# Altium footprint library General.PcbLib: 446 footprints (part 10 of 28)
Each footprint in its own frame and in the unit in brackets; x right, y up, seen from the top. Pads: shape width x height; smd on the part's side, far side on the other; paste and mask are expansions set on the pad; w line width, h text height; cw(c..) or ccw(c..) is an arc to the next point about the centre after c.
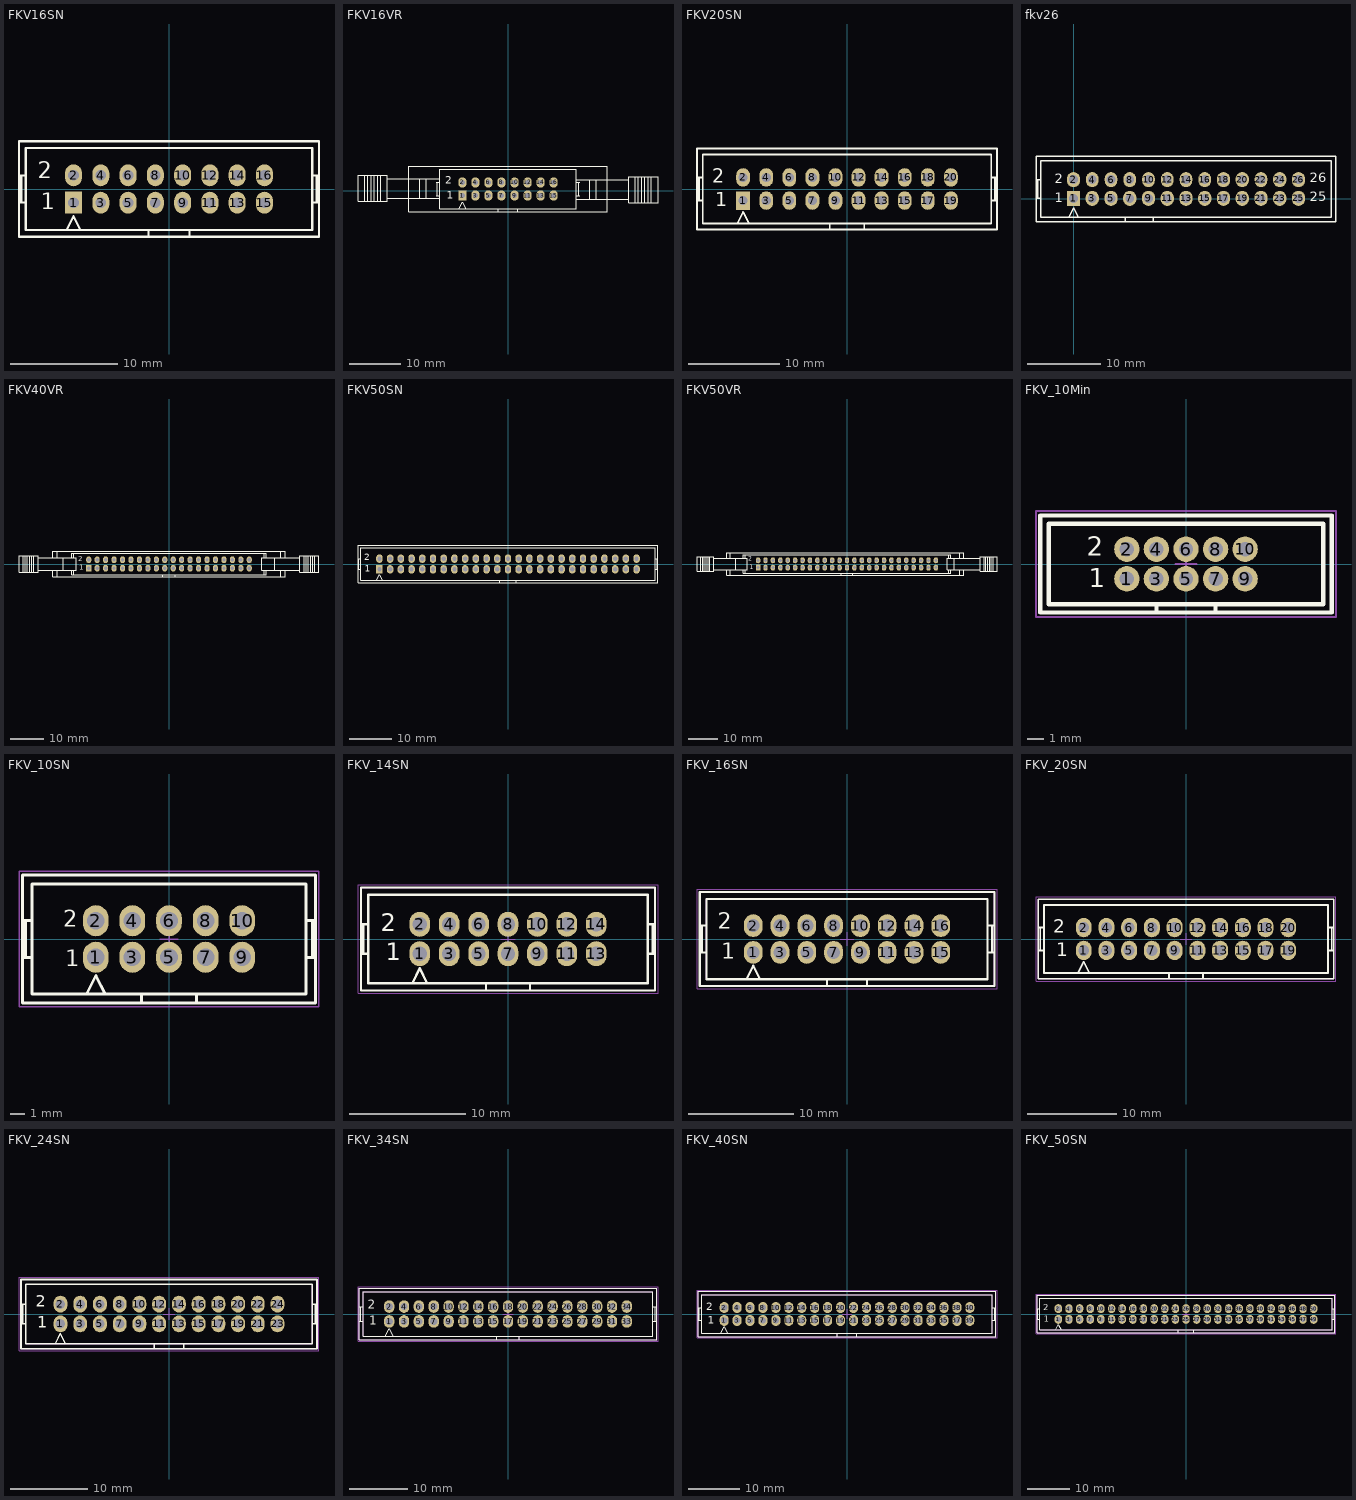
[diagram p9: the footprints below, top view; thin cyan lines are the x and y axes]

## FKV16SN [mil]
pads (16):
  rect 62x80 hole 39.37: 1(-350,-50)
  oval 62x80 hole 39.37: 2(-350,50) 3(-250,-50) 4(-250,50) 5(-150,-50) 6(-150,50) 7(-50,-50) 8(-50,50) 9(50,-50) 10(50,50) 11(150,-50) 12(150,50) 13(250,-50) 14(250,50) 15(350,-50) 16(350,50)
Top Overlay:
  lines w8: -550,-50 -525,-50 ; -550,50 -525,50 ; -541.67,-50 -541.67,50 ; -375,-150 -350,-100 -325,-150 ; -75,-175 -75,-150 ; 75,-175 75,-150 ; 525,-50 550,-50 ; 525,50 550,50 ; 541.67,-50 541.67,-41.67 541.67,50 ; -75,-150 75,-150 ; -75,-150 -525,-150 -525,150 525,150 525,-150 75,-150 ; -550,-175 550,-175 550,175 -550,175 -550,-175
  text "1" at -470,-74 h60
  text "2" at -482,39 h60

## FKV16VR [mil]
pads (16):
  rect 62x80 hole 39.37: 1(-350,-35)
  oval 62x80 hole 39.37: 2(-350,65) 3(-250,-35) 4(-250,65) 5(-150,-35) 6(-150,65) 7(-50,-35) 8(-50,65) 9(50,-35) 10(50,65) 11(150,-35) 12(150,65) 13(250,-35) 14(250,65) 15(350,-35) 16(350,65)
Top Overlay:
  lines w8: -1100,-80 -1100,120 ; -1075,-80 -1075,120 ; -1050,-80 -1050,120 ; -1025,-80 -1025,120 ; -1000,-80 -1000,120 ; -975,-80 -975,120 ; -925,-55 -525,-55 -525,-105 ; -925,95 -525,95 -525,145 ; -675,-55 -675,95 ; -625,-55 -625,95 ; -550,-35 -525,-35 ; -550,65 -525,65 ; -541.67,-35 -541.67,65 ; -375,-135 -350,-85 -325,-135 ; -75,-160 -75,-135 ; 75,-160 75,-135 ; 525,-115 525,-65 925,-65 ; 525,-35 550,-35 ; 525,65 550,65 ; 525,135 525,85 925,85 ; 541.67,-35 541.67,-26.67 541.67,65 ; 625,-65 625,85 ; 675,-65 675,85 ; 975,-90 975,110 ; 1000,-90 1000,110 ; 1025,-90 1025,110 ; 1050,-90 1050,110 ; 1075,-90 1075,110 ; 1100,-90 1100,110 ; -550,190 760,190 ; -550,190 760,190 ; -550,190 760,190 ; -75,-135 75,-135 ; -75,-135 -525,-135 -525,165 525,165 525,-135 75,-135 ; 760,190 -760,190 -760,-160 760,-160 760,190 ; -1150,-80 -925,-80 -925,120 -1150,120 -1150,-80 ; 925,-90 925,110 1150,110 1150,-90 925,-90
  text "1" at -470,-59 h60
  text "2" at -482,54 h60

## FKV20SN [mil]
height 47.24
pads (20):
  rect 60x80 hole 39.37: 1(-450,-50)
  oval 60x80 hole 39.37: 2(-450,50) 3(-350,-50) 4(-350,50) 5(-250,-50) 6(-250,50) 7(-150,-50) 8(-150,50) 9(-50,-50) 10(-50,50) 11(50,-50) 12(50,50) 13(150,-50) 14(150,50) 15(250,-50) 16(250,50) 17(350,-50) 18(350,50) 19(450,-50) 20(450,50)
Top Overlay:
  lines w8: -650,-50 -625,-50 ; -650,50 -625,50 ; -641.67,-50 -641.67,50 ; -475,-150 -450,-100 -425,-150 ; -75,-175 -75,-150 ; 75,-175 75,-150 ; 625,-50 650,-50 ; 625,50 650,50 ; 641.67,-50 641.67,50 ; -75,-150 75,-150 ; -75,-150 -625,-150 -625,150 625,150 625,-150 75,-150 ; -650,-175 650,-175 650,175 -650,175 -650,-175
  text "1" at -572,-75 h60
  text "2" at -585,27 h60

## fkv26 [mm]
pads (26):
  rect 1.8x2.032 hole 1.2: 1(0,0.025)
  oval 1.8x2.032 hole 1.2: 2(0,2.565) 3(2.54,0.025) 5(5.08,0.025) 7(7.62,0.025) 9(10.16,0.025) 11(12.7,0.025) 13(15.24,0.025) 15(17.78,0.025) 17(20.32,0.025) 18(20.32,2.565) 19(22.86,0.025) 20(22.86,2.565) 21(25.4,0.025) 23(27.94,0.025) 24(27.94,2.565) 25(30.48,0.025) 26(30.48,2.565)
  oval 1.7x2.032 hole 1.2: 4(2.54,2.565) 6(5.08,2.565) 8(7.62,2.565) 10(10.16,2.565) 12(12.7,2.565) 14(15.24,2.565) 16(17.78,2.565) 22(25.4,2.565)
Top Overlay:
  lines w0.203: -5.08,0.025 -4.445,0.025 ; -5.08,2.565 -4.445,2.565 ; -4.868,0.025 -4.868,2.565 ; -0.635,-2.515 0,-1.245 0.635,-2.515 ; 6.985,-3.15 6.985,-2.515 ; 10.795,-3.15 10.795,-2.515 ; 6.985,-2.515 -4.445,-2.515 -4.445,5.105 34.925,5.105 34.925,-2.515 10.795,-2.515 ; 6.985,-2.515 10.795,-2.515 ; -5.08,-3.15 -5.08,5.74 35.56,5.74 35.56,-3.15 -5.08,-3.15
  text "26" at 32.004,2.184 h1.27
  text "25" at 32.004,-0.356 h1.27
  text "1" at -2.54,-0.483 h1.27
  text "2" at -2.54,2.057 h1.27

## FKV40VR [mil]
height 47.24
pads (40):
  rect 60x80 hole 39.37: 1(-950,-50)
  oval 60x80 hole 39.37: 2(-950,50) 3(-850,-50) 4(-850,50) 5(-750,-50) 6(-750,50) 7(-650,-50) 8(-650,50) 9(-550,-50) 10(-550,50) 11(-450,-50) 12(-450,50) 13(-350,-50) 14(-350,50) 15(-250,-50) 16(-250,50) 17(-150,-50) 18(-150,50) 19(-50,-50) 20(-50,50) 21(50,-50) 22(50,50) 23(150,-50) 24(150,50) 25(250,-50) 26(250,50) 27(350,-50) 28(350,50) 29(450,-50) 30(450,50) 31(550,-50) 32(550,50) 33(650,-50) 34(650,50) 35(750,-50) 36(750,50) 37(850,-50) 38(850,50) 39(950,-50) 40(950,50)
Top Overlay:
  lines w8: -1725,-100 -1725,100 ; -1700,-100 -1700,100 ; -1675,-100 -1675,100 ; -1650,-100 -1650,100 ; -1625,-100 -1625,100 ; -1600,-100 -1600,100 ; -1550,-75 -1150,-75 ; -1550,75 -1150,75 ; -1375,-75 -1375,-150 1375,-150 1375,-75 ; -1375,75 -1375,150 1375,150 1375,75 ; -1325,-150 -1325,-75 ; -1325,75 -1325,150 ; -1250,-75 -1250,75 ; -1125,-125 -1125,-75 ; -1125,75 -1125,125 ; -75,-150 -75,-125 ; 75,-150 75,-125 ; 1125,-125 1125,-75 ; 1125,75 1125,125 ; 1250,-75 1250,75 ; 1325,-150 1325,-75 ; 1325,75 1325,150 ; 1550,-75 1150,-75 ; 1550,75 1150,75 ; 1600,-100 1600,100 ; 1625,-100 1625,100 ; 1650,-100 1650,100 ; 1675,-100 1675,100 ; 1700,-100 1700,100 ; 1725,-100 1725,100 ; -1150,-75 -1100,-75 -1100,75 -1150,75 ; -1150,-75 -1150,-125 -75,-125 ; -1150,75 -1150,125 1150,125 1150,75 ; -75,-125 75,-125 ; 75,-125 1150,-125 1150,-75 ; 1150,-75 1100,-75 1100,75 1150,75 ; 1775,-100 1775,100 ; 1775,-100 1775,100 ; 1775,-100 1775,100 ; 1775,-100 1550,-100 1550,100 1775,100 ; -1775,-100 -1775,100 -1550,100 -1550,-100 -1775,-100
  text "2" at -1072,35 h60
  text "1" at -1062,-70 h60

## FKV50SN [mil]
height 47.24
pads (50):
  rect 60x80 hole 39.37: 1(-1200,-50)
  oval 60x80 hole 39.37: 2(-1200,50) 3(-1100,-50) 4(-1100,50) 5(-1000,-50) 6(-1000,50) 7(-900,-50) 8(-900,50) 9(-800,-50) 10(-800,50) 11(-700,-50) 12(-700,50) 13(-600,-50) 14(-600,50) 15(-500,-50) 16(-500,50) 17(-400,-50) 18(-400,50) 19(-300,-50) 20(-300,50) 21(-200,-50) 22(-200,50) 23(-100,-50) 24(-100,50) 25(0,-50) 26(0,50) 27(100,-50) 28(100,50) 29(200,-50) 30(200,50) 31(300,-50) 32(300,50) 33(400,-50) 34(400,50) 35(500,-50) 36(500,50) 37(600,-50) 38(600,50) 39(700,-50) 40(700,50) 41(800,-50) 42(800,50) 43(900,-50) 44(900,50) 45(1000,-50) 46(1000,50) 47(1100,-50) 48(1100,50) 49(1200,-50) 50(1200,50)
Top Overlay:
  lines w8: -1400,-50 -1375,-50 ; -1400,50 -1375,50 ; -1391.67,-50 -1391.67,50 ; -1225,-150 -1200,-100 -1175,-150 ; -75,-175 -75,-150 ; 75,-175 75,-150 ; 1375,-50 1400,-50 ; 1375,50 1400,50 ; 1391.67,-50 1391.67,50 ; -75,-150 75,-150 ; -75,-150 -1375,-150 -1375,150 1375,150 1375,-150 75,-150 ; -1400,-175 1400,-175 1400,175 -1400,175 -1400,-175
  text "2" at -1343,34 h60
  text "1" at -1335,-71 h60

## FKV50VR [mil]
pads (50):
  rect 60x80 hole 39.37: 1(-1200,-50)
  oval 60x80 hole 39.37: 2(-1200,50) 3(-1100,-50) 4(-1100,50) 5(-1000,-50) 6(-1000,50) 7(-900,-50) 8(-900,50) 9(-800,-50) 10(-800,50) 11(-700,-50) 12(-700,50) 13(-600,-50) 14(-600,50) 15(-500,-50) 16(-500,50) 17(-400,-50) 18(-400,50) 19(-300,-50) 20(-300,50) 21(-200,-50) 22(-200,50) 23(-100,-50) 24(-100,50) 25(0,-50) 26(0,50) 27(100,-50) 28(100,50) 29(200,-50) 30(200,50) 31(300,-50) 32(300,50) 33(400,-50) 34(400,50) 35(500,-50) 36(500,50) 37(600,-50) 38(600,50) 39(700,-50) 40(700,50) 41(800,-50) 42(800,50) 43(900,-50) 44(900,50) 45(1000,-50) 46(1000,50) 47(1100,-50) 48(1100,50) 49(1200,-50) 50(1200,50)
Top Overlay:
  lines w8: -1975,-100 -1975,100 ; -1950,-100 -1950,100 ; -1925,-100 -1925,100 ; -1900,-100 -1900,100 ; -1875,-100 -1875,100 ; -1850,-100 -1850,100 ; -1800,-75 -1400,-75 ; -1800,75 -1400,75 ; -1625,-75 -1625,-150 1575,-150 1575,-75 ; -1625,75 -1625,150 1575,150 1575,75 ; -1575,-150 -1575,-75 ; -1575,75 -1575,150 ; -1500,-75 -1500,75 ; -1375,-125 -1375,-75 ; -1375,75 -1375,125 ; -75,-150 -75,-125 ; 75,-150 75,-125 ; 1375,-125 1375,-75 ; 1375,75 1375,125 ; 1450,-75 1450,75 ; 1525,-150 1525,-75 ; 1525,75 1525,150 ; 1800,-75 1400,-75 ; 1800,75 1400,75 ; 1850,-100 1850,100 ; 1875,-100 1875,100 ; 1900,-100 1900,100 ; 1925,-100 1925,100 ; 1950,-100 1950,100 ; 1975,-100 1975,100 ; -1400,-75 -1350,-75 -1350,75 -1400,75 ; -1400,-75 -1400,-125 -75,-125 ; -1400,75 -1400,125 1400,125 1400,75 ; -75,-125 75,-125 ; 75,-125 1400,-125 1400,-75 ; 1400,-75 1350,-75 1350,75 1400,75 ; -2025,-100 -2025,100 -1800,100 -1800,-100 -2025,-100 ; 1800,-100 1800,100 2025,100 2025,-100 1800,-100
  text "2" at -1330,47 h60
  text "1" at -1314,-73 h60

## FKV_10Min [mil] "Connector; BoxHeader; 5x2 Position ,2.54mm Pitch"
height 346.46
pads (10):
  round 60 hole 34: 1(-140,-35) 2(-140,35) 3(-70,-35) 4(-70,35) 5(0,-35) 6(0,35) 7(70,-35) 8(70,35) 9(140,-35) 10(140,35)
Top Overlay:
  lines w10: -70,-115 -70,-95 ; 70,-115 70,-95 ; -345,-115 345,-115 345,115 -345,115 -345,-115 ; -325,-95 325,-95 325,95 -325,95 -325,-95
  text "2" at -235,20 h45
  text "1" at -230,-55 h45
Mechanical 15:
  lines w5: -25,0 0,0 ; 0,-25 0,0 ; 0,25 0,0 ; 25,0 0,0 ; -355,-125 355,-125 355,125 -330,125 -355,125 -355,-125
3D body: height 220, standoff 0, extent 70,-110 340,-90
3D body: height 220, standoff 0, extent -340,-110 -70,-90
3D body: height 220, standoff 0, extent 320,-110 340,110
3D body: height 220, standoff 0, extent -340,90 340,110
3D body: height 220, standoff 0, extent -340,-110 -320,110
3D body: height 20, standoff 0, extent -340,-110 340,110
3D body: height 220, standoff -110, extent -150,-45 -130,-25
3D body: height 220, standoff -110, extent -80,-45 -60,-25
3D body: height 220, standoff -110, extent -10,-45 10,-25
3D body: height 220, standoff -110, extent 60,-45 80,-25
3D body: height 220, standoff -110, extent 130,-45 150,-25
3D body: height 220, standoff -110, extent 130,25 150,45
3D body: height 220, standoff -110, extent 60,25 80,45
3D body: height 220, standoff -110, extent -10,25 10,45
3D body: height 220, standoff -110, extent -80,25 -60,45
3D body: height 220, standoff -110, extent -150,25 -130,45

## FKV_10SN [mil] "Connector; BoxHeader; 5x2 Position ,2.54mm Pitch"
height 346.46
pads (10):
  oval 70x85 hole 48: 1(-200,-50) 2(-200,50) 3(-100,-50) 4(-100,50) 5(0,-50) 6(0,50) 7(100,-50) 8(100,50) 9(200,-50) 10(200,50)
Top Overlay:
  lines w8: -400,-50 -375,-50 ; -400,50 -375,50 ; -391.67,-50 -391.67,50 ; -225,-150 -200,-100 -175,-150 ; -75,-175 -75,-150 ; 75,-175 75,-150 ; 375,-50 400,-50 ; 375,50 400,50 ; 391.67,-50 391.67,50 ; -75,-150 -375,-150 -375,150 375,150 375,-150 75,-150 ; -75,-150 75,-150 ; -400,-175 400,-175 400,175 -400,175 -400,-175
  text "2" at -289,33 h45
  text "1" at -283,-75 h45
Mechanical 13:
  lines w3.94: -75,-175 -75,-150 ; 75,-175 75,-150 ; -75,-150 75,-150 ; -75,-150 -375,-150 -375,150 375,150 375,-150 75,-150 ; 87.5,-62.5 100,-62.5 ; 87.5,-62.5 87.5,-50 ; 87.5,-62.5 100,-62.5 ; 87.5,-62.5 87.5,-50 ; 87.5,-50 87.5,-37.5 ; 87.5,-50 87.5,-37.5 ; 87.5,-37.5 100,-37.5 ; 87.5,-37.5 100,-37.5 ; 100,-62.5 112.5,-62.5 ; 100,-62.5 112.5,-62.5 ; 100,-37.5 112.5,-37.5 ; 100,-37.5 112.5,-37.5 ; 112.5,-62.5 112.5,-50 ; 112.5,-62.5 112.5,-50 ; 112.5,-50 112.5,-37.5 ; 112.5,-50 112.5,-37.5 ; -400,-175 -400,175 400,175 400,-175 -400,-175 ; -212.5,-62.5 -212.5,-50 -212.5,-37.5 -200,-37.5 -187.5,-37.5 -187.5,-50 -187.5,-62.5 -200,-62.5 -212.5,-62.5 ; -212.5,37.5 -200,37.5 -187.5,37.5 -187.5,50 -187.5,62.5 -200,62.5 -212.5,62.5 -212.5,50 -212.5,37.5 ; -112.5,-62.5 -100,-62.5 -87.5,-62.5 -87.5,-50 -87.5,-37.5 -100,-37.5 -112.5,-37.5 -112.5,-50 -112.5,-62.5 ; -112.5,37.5 -100,37.5 -87.5,37.5 -87.5,50 -87.5,62.5 -100,62.5 -112.5,62.5 -112.5,50 -112.5,37.5 ; -12.5,-62.5 0,-62.5 12.5,-62.5 12.5,-50 12.5,-37.5 0,-37.5 -12.5,-37.5 -12.5,-50 -12.5,-62.5 ; -12.5,37.5 0,37.5 12.5,37.5 12.5,50 12.5,62.5 0,62.5 -12.5,62.5 -12.5,50 -12.5,37.5 ; 87.5,37.5 100,37.5 112.5,37.5 112.5,50 112.5,62.5 100,62.5 87.5,62.5 87.5,50 87.5,37.5 ; 187.5,-62.5 200,-62.5 212.5,-62.5 212.5,-50 212.5,-37.5 200,-37.5 187.5,-37.5 187.5,-50 187.5,-62.5 ; 187.5,37.5 200,37.5 212.5,37.5 212.5,50 212.5,62.5 200,62.5 187.5,62.5 187.5,50 187.5,37.5
Mechanical 15:
  lines w3.94: -25,0 0,0 ; 0,-25 0,0 ; 0,25 0,0 ; 25,0 0,0 ; -410,-185 410,-185 410,185 -410,185 -410,-185
3D body: height 314.96, standoff -129.92, extent -212.48,37.52 -187.52,62.48
3D body: height 314.96, standoff -129.92, extent -112.48,37.52 -87.52,62.48
3D body: height 314.96, standoff -129.92, extent -12.48,37.52 12.48,62.48
3D body: height 314.96, standoff -129.92, extent 87.52,37.52 112.48,62.48
3D body: height 314.96, standoff -129.92, extent 187.52,37.52 212.48,62.48
3D body: height 314.96, standoff -129.92, extent 187.52,-62.48 212.48,-37.52
3D body: height 314.96, standoff -129.92, extent 87.52,-62.48 112.48,-37.52
3D body: height 314.96, standoff -129.92, extent -12.48,-62.48 12.48,-37.52
3D body: height 314.96, standoff -129.92, extent -112.48,-62.48 -87.52,-37.52
3D body: height 314.96, standoff -129.92, extent -212.48,-62.48 -187.52,-37.52
3D body: height 118.11, standoff 0, extent -74.98,-174.98 74.98,-150.02
3D body: height 78.74, standoff 0, extent -374.98,-149.98 374.98,149.98
3D body: height 346.46, standoff 0, extent -399.98,-174.98 399.98,174.98

## FKV_14SN [mil] "Connector; BoxHeader; 7x2 Position ,2.54mm Pitch"
height 346.46
pads (14):
  oval 70x85 hole 48: 1(-300,-50) 2(-300,50) 3(-200,-50) 4(-200,50) 5(-100,-50) 6(-100,50) 7(0,-50) 8(0,50) 9(100,-50) 10(100,50) 11(200,-50) 12(200,50) 13(300,-50) 14(300,50)
Top Overlay:
  lines w8: -500,-50 -475,-50 ; -500,50 -475,50 ; -491.67,-50 -491.67,50 ; -325,-150 -300,-100 -275,-150 ; -75,-175 -75,-150 ; 75,-175 75,-150 ; 475,-50 500,-50 ; 475,50 500,50 ; 491.67,-50 491.67,50 ; -75,-150 -475,-150 -475,150 475,150 475,-150 75,-150 ; -75,-150 75,-150 ; -500,-175 -500,175 500,175 500,-175 -500,-175
  text "1" at -415,-73 h60
  text "2" at -432,26 h60
Mechanical 13:
  lines w3.94: -75,-175 -75,-150 ; 75,-175 75,-150 ; -75,-150 75,-150 ; -75,-150 -475,-150 -475,150 475,150 475,-150 75,-150 ; -500,-175 500,-175 500,175 -500,175 -500,-175 ; -312.5,-62.5 -312.5,-50 -312.5,-37.5 -300,-37.5 -287.5,-37.5 -287.5,-50 -287.5,-62.5 -300,-62.5 -312.5,-62.5 ; -312.5,37.5 -300,37.5 -287.5,37.5 -287.5,50 -287.5,62.5 -300,62.5 -312.5,62.5 -312.5,50 -312.5,37.5 ; -212.5,-62.5 -200,-62.5 -187.5,-62.5 -187.5,-50 -187.5,-37.5 -200,-37.5 -212.5,-37.5 -212.5,-50 -212.5,-62.5 ; -212.5,37.5 -200,37.5 -187.5,37.5 -187.5,50 -187.5,62.5 -200,62.5 -212.5,62.5 -212.5,50 -212.5,37.5 ; -112.5,-62.5 -112.5,-50 -112.5,-37.5 -100,-37.5 -87.5,-37.5 -87.5,-50 -87.5,-62.5 -100,-62.5 -112.5,-62.5 ; -112.5,37.5 -100,37.5 -87.5,37.5 -87.5,50 -87.5,62.5 -100,62.5 -112.5,62.5 -112.5,50 -112.5,37.5 ; -12.5,-62.5 0,-62.5 12.5,-62.5 12.5,-50 12.5,-37.5 0,-37.5 -12.5,-37.5 -12.5,-50 -12.5,-62.5 ; -12.5,37.5 0,37.5 12.5,37.5 12.5,50 12.5,62.5 0,62.5 -12.5,62.5 -12.5,50 -12.5,37.5 ; 87.5,-62.5 87.5,-50 87.5,-37.5 100,-37.5 112.5,-37.5 112.5,-50 112.5,-62.5 100,-62.5 87.5,-62.5 ; 87.5,37.5 100,37.5 112.5,37.5 112.5,50 112.5,62.5 100,62.5 87.5,62.5 87.5,50 87.5,37.5 ; 187.5,-62.5 200,-62.5 212.5,-62.5 212.5,-50 212.5,-37.5 200,-37.5 187.5,-37.5 187.5,-50 187.5,-62.5 ; 187.5,37.5 200,37.5 212.5,37.5 212.5,50 212.5,62.5 200,62.5 187.5,62.5 187.5,50 187.5,37.5 ; 287.5,-62.5 287.5,-50 287.5,-37.5 300,-37.5 312.5,-37.5 312.5,-50 312.5,-62.5 300,-62.5 287.5,-62.5 ; 287.5,37.5 300,37.5 312.5,37.5 312.5,50 312.5,62.5 300,62.5 287.5,62.5 287.5,50 287.5,37.5
Mechanical 15:
  lines w3.94: -25,0 0,0 ; 0,-25 0,0 ; 0,25 0,0 ; 25,0 0,0 ; -510,-185 -510,185 510,185 510,-185 -510,-185
3D body: height 314.96, standoff -129.92, extent 287.52,37.52 312.48,62.48
3D body: height 314.96, standoff -129.92, extent 287.52,-62.48 312.48,-37.52
3D body: height 314.96, standoff -129.92, extent 87.52,37.52 112.48,62.48
3D body: height 314.96, standoff -129.92, extent 187.52,37.52 212.48,62.48
3D body: height 314.96, standoff -129.92, extent 187.52,-62.48 212.48,-37.52
3D body: height 314.96, standoff -129.92, extent 87.52,-62.48 112.48,-37.52
3D body: height 314.96, standoff -129.92, extent -112.48,37.52 -87.52,62.48
3D body: height 314.96, standoff -129.92, extent -12.48,37.52 12.48,62.48
3D body: height 314.96, standoff -129.92, extent -12.48,-62.48 12.48,-37.52
3D body: height 314.96, standoff -129.92, extent -112.48,-62.48 -87.52,-37.52
3D body: height 314.96, standoff -129.92, extent -312.48,37.52 -287.52,62.48
3D body: height 314.96, standoff -129.92, extent -212.48,37.52 -187.52,62.48
3D body: height 314.96, standoff -129.92, extent -212.48,-62.48 -187.52,-37.52
3D body: height 314.96, standoff -129.92, extent -312.48,-62.48 -287.52,-37.52
3D body: height 346.46, standoff 0, extent -499.98,-174.98 499.98,174.98
3D body: height 78.74, standoff 0, extent -474.98,-149.98 474.98,149.98
3D body: height 118.11, standoff 0, extent -74.98,-174.98 74.98,-150.02

## FKV_16SN [mil] "Connector; BoxHeader; 8x2 Position ,2.54mm Pitch"
height 346.46
pads (16):
  oval 70x85 hole 48: 1(-350,-50) 2(-350,50) 3(-250,-50) 4(-250,50) 5(-150,-50) 6(-150,50) 7(-50,-50) 8(-50,50) 9(50,-50) 10(50,50) 11(150,-50) 12(150,50) 13(250,-50) 14(250,50) 15(350,-50) 16(350,50)
Top Overlay:
  lines w8: -550,-50 -525,-50 ; -550,50 -525,50 ; -541.67,-50 -541.67,50 ; -375,-150 -350,-100 -325,-150 ; -75,-175 -75,-150 ; 75,-175 75,-150 ; 525,-50 550,-50 ; 525,50 550,50 ; 541.67,-50 541.67,-41.67 541.67,50 ; -75,-150 -525,-150 -525,150 525,150 525,-150 75,-150 ; -75,-150 75,-150 ; -550,-175 -550,175 550,175 550,-175 -550,-175
  text "2" at -482,39 h60
  text "1" at -470,-74 h60
Mechanical 13:
  lines w3.94: -75,-175 -75,-150 ; 75,-175 75,-150 ; -75,-150 75,-150 ; -75,-150 -525,-150 -525,150 525,150 525,-150 75,-150 ; -550,-175 550,-175 550,175 -550,175 -550,-175 ; -362.5,-62.5 -350,-62.5 -337.5,-62.5 -337.5,-50 -337.5,-37.5 -350,-37.5 -362.5,-37.5 -362.5,-50 -362.5,-62.5 ; -362.5,37.5 -362.5,50 -362.5,62.5 -350,62.5 -337.5,62.5 -337.5,50 -337.5,37.5 -350,37.5 -362.5,37.5 ; -262.5,-62.5 -262.5,-50 -262.5,-37.5 -250,-37.5 -237.5,-37.5 -237.5,-50 -237.5,-62.5 -250,-62.5 -262.5,-62.5 ; -262.5,37.5 -262.5,50 -262.5,62.5 -250,62.5 -237.5,62.5 -237.5,50 -237.5,37.5 -250,37.5 -262.5,37.5 ; -162.5,-62.5 -150,-62.5 -137.5,-62.5 -137.5,-50 -137.5,-37.5 -150,-37.5 -162.5,-37.5 -162.5,-50 -162.5,-62.5 ; -162.5,37.5 -162.5,50 -162.5,62.5 -150,62.5 -137.5,62.5 -137.5,50 -137.5,37.5 -150,37.5 -162.5,37.5 ; -62.5,-62.5 -62.5,-50 -62.5,-37.5 -50,-37.5 -37.5,-37.5 -37.5,-50 -37.5,-62.5 -50,-62.5 -62.5,-62.5 ; -62.5,37.5 -62.5,50 -62.5,62.5 -50,62.5 -37.5,62.5 -37.5,50 -37.5,37.5 -50,37.5 -62.5,37.5 ; 37.5,-62.5 50,-62.5 62.5,-62.5 62.5,-50 62.5,-37.5 50,-37.5 37.5,-37.5 37.5,-50 37.5,-62.5 ; 37.5,37.5 37.5,50 37.5,62.5 50,62.5 62.5,62.5 62.5,50 62.5,37.5 50,37.5 37.5,37.5 ; 137.5,-62.5 137.5,-50 137.5,-37.5 150,-37.5 162.5,-37.5 162.5,-50 162.5,-62.5 150,-62.5 137.5,-62.5 ; 137.5,37.5 137.5,50 137.5,62.5 150,62.5 162.5,62.5 162.5,50 162.5,37.5 150,37.5 137.5,37.5 ; 237.5,-62.5 250,-62.5 262.5,-62.5 262.5,-50 262.5,-37.5 250,-37.5 237.5,-37.5 237.5,-50 237.5,-62.5 ; 237.5,37.5 237.5,50 237.5,62.5 250,62.5 262.5,62.5 262.5,50 262.5,37.5 250,37.5 237.5,37.5 ; 337.5,-62.5 337.5,-50 337.5,-37.5 350,-37.5 362.5,-37.5 362.5,-50 362.5,-62.5 350,-62.5 337.5,-62.5 ; 337.5,37.5 337.5,50 337.5,62.5 350,62.5 362.5,62.5 362.5,50 362.5,37.5 350,37.5 337.5,37.5
Mechanical 15:
  lines w3.94: -25,0 0,0 ; 0,-25 0,0 ; 0,25 0,0 ; 25,0 0,0 ; -560,-185 -560,185 560,185 560,-185 -560,-185
3D body: height 314.96, standoff -129.92, extent 237.52,-62.48 262.48,-37.52
3D body: height 314.96, standoff -129.92, extent 337.52,-62.48 362.48,-37.52
3D body: height 314.96, standoff -129.92, extent 337.52,37.52 362.48,62.48
3D body: height 314.96, standoff -129.92, extent 237.52,37.52 262.48,62.48
3D body: height 314.96, standoff -129.92, extent 37.52,-62.48 62.48,-37.52
3D body: height 314.96, standoff -129.92, extent 137.52,-62.48 162.48,-37.52
3D body: height 314.96, standoff -129.92, extent 137.52,37.52 162.48,62.48
3D body: height 314.96, standoff -129.92, extent 37.52,37.52 62.48,62.48
3D body: height 314.96, standoff -129.92, extent -162.48,-62.48 -137.52,-37.52
3D body: height 314.96, standoff -129.92, extent -62.48,-62.48 -37.52,-37.52
3D body: height 314.96, standoff -129.92, extent -62.48,37.52 -37.52,62.48
3D body: height 314.96, standoff -129.92, extent -162.48,37.52 -137.52,62.48
3D body: height 314.96, standoff -129.92, extent -362.48,-62.48 -337.52,-37.52
3D body: height 314.96, standoff -129.92, extent -262.48,-62.48 -237.52,-37.52
3D body: height 314.96, standoff -129.92, extent -262.48,37.52 -237.52,62.48
3D body: height 314.96, standoff -129.92, extent -362.48,37.52 -337.52,62.48
3D body: height 346.46, standoff 0, extent -549.98,-174.98 549.98,174.98
3D body: height 78.74, standoff 0, extent -524.98,-149.98 524.98,149.98
3D body: height 118.11, standoff 0, extent -74.98,-174.98 74.98,-150.02

## FKV_20SN [mil] "Connector; BoxHeader; 10x2 Position ,2.54mm Pitch"
height 346.46
pads (20):
  oval 70x85 hole 48: 1(-450,-50) 2(-450,50) 3(-350,-50) 4(-350,50) 5(-250,-50) 6(-250,50) 7(-150,-50) 8(-150,50) 9(-50,-50) 10(-50,50) 11(50,-50) 12(50,50) 13(150,-50) 14(150,50) 15(250,-50) 16(250,50) 17(350,-50) 18(350,50) 19(450,-50) 20(450,50)
Top Overlay:
  lines w8: -650,-50 -625,-50 ; -650,50 -625,50 ; -641.67,-50 -641.67,50 ; -475,-150 -450,-100 -425,-150 ; -75,-175 -75,-150 ; 75,-175 75,-150 ; 625,-50 650,-50 ; 625,50 650,50 ; 641.67,-50 641.67,50 ; -75,-150 -625,-150 -625,150 625,150 625,-150 75,-150 ; -75,-150 75,-150 ; -650,-175 -650,175 650,175 650,-175 -650,-175
  text "2" at -585,27 h60
  text "1" at -572,-75 h60
Mechanical 13:
  drawing of 172 lines, arcs and shapes, not listed
Mechanical 15:
  lines w3.94: -25,0 0,0 ; 0,-25 0,0 ; 0,25 0,0 ; 25,0 0,0 ; -660,-185 660,-185 660,185 -660,185 -660,-185
3D body: height 314.96, standoff -129.92, extent 337.52,37.52 362.48,62.48
3D body: height 314.96, standoff -129.92, extent 437.52,37.52 462.48,62.48
3D body: height 314.96, standoff -129.92, extent 437.52,-62.48 462.48,-37.52
3D body: height 314.96, standoff -129.92, extent 337.52,-62.48 362.48,-37.52
3D body: height 314.96, standoff -129.92, extent 137.52,37.52 162.48,62.48
3D body: height 314.96, standoff -129.92, extent 237.52,37.52 262.48,62.48
3D body: height 314.96, standoff -129.92, extent 237.52,-62.48 262.48,-37.52
3D body: height 314.96, standoff -129.92, extent 137.52,-62.48 162.48,-37.52
3D body: height 314.96, standoff -129.92, extent -62.48,37.52 -37.52,62.48
3D body: height 314.96, standoff -129.92, extent 37.52,37.52 62.48,62.48
3D body: height 314.96, standoff -129.92, extent 37.52,-62.48 62.48,-37.52
3D body: height 314.96, standoff -129.92, extent -62.48,-62.48 -37.52,-37.52
3D body: height 314.96, standoff -129.92, extent -262.48,37.52 -237.52,62.48
3D body: height 314.96, standoff -129.92, extent -162.48,37.52 -137.52,62.48
3D body: height 314.96, standoff -129.92, extent -162.48,-62.48 -137.52,-37.52
3D body: height 314.96, standoff -129.92, extent -262.48,-62.48 -237.52,-37.52
3D body: height 314.96, standoff -129.92, extent -462.48,37.52 -437.52,62.48
3D body: height 314.96, standoff -129.92, extent -362.48,37.52 -337.52,62.48
3D body: height 314.96, standoff -129.92, extent -362.48,-62.48 -337.52,-37.52
3D body: height 314.96, standoff -129.92, extent -462.48,-62.48 -437.52,-37.52
3D body: height 346.46, standoff 0, extent -649.98,-174.98 649.98,174.98
3D body: height 78.74, standoff 0, extent -624.98,-149.98 624.98,149.98
3D body: height 118.11, standoff 0, extent -74.98,-174.98 74.98,-150.02

## FKV_24SN [mil] "Connector; BoxHeader; 12x2 Position ,2.54mm Pitch"
height 346.46
pads (24):
  oval 70x85 hole 48: 1(-550,-50) 2(-550,50) 3(-450,-50) 4(-450,50) 5(-350,-50) 6(-350,50) 7(-250,-50) 8(-250,50) 9(-150,-50) 10(-150,50) 11(-50,-50) 12(-50,50) 13(50,-50) 14(50,50) 15(150,-50) 16(150,50) 17(250,-50) 18(250,50) 19(350,-50) 20(350,50) 21(450,-50) 22(450,50) 23(550,-50) 24(550,50)
Top Overlay:
  lines w8: -750,-50 -725,-50 ; -750,50 -725,50 ; -741.67,-50 -741.67,50 ; -575,-150 -550,-100 -525,-150 ; -75,-175 -75,-150 ; 75,-175 75,-150 ; 725,-50 750,-50 ; 725,50 750,50 ; 741.67,-50 741.67,50 ; -75,-150 -725,-150 -725,150 725,150 725,-150 75,-150 ; -75,-150 75,-150 ; -750,-175 -750,175 750,175 750,-175 -750,-175
  text "2" at -674,36 h60
  text "1" at -668,-70 h60
Mechanical 13:
  drawing of 204 lines, arcs and shapes, not listed
Mechanical 15:
  lines w3.94: -30,0 0,0 ; 0,-30 0,0 ; 0,30 0,0 ; 30,0 0,0 ; -760,-185 760,-185 760,185 -760,185 -760,-185
3D body: height 346.46, standoff 0, extent -749.98,-174.98 749.98,174.98
3D body: height 78.74, standoff 0, extent -724.98,-149.98 724.98,149.98
3D body: height 118.11, standoff 0, extent -74.98,-174.98 74.98,-150.02
3D body: height 314.96, standoff -129.92, extent -562.48,-62.48 -537.52,-37.52
3D body: height 314.96, standoff -129.92, extent -462.48,-62.48 -437.52,-37.52
3D body: height 314.96, standoff -129.92, extent -462.48,37.52 -437.52,62.48
3D body: height 314.96, standoff -129.92, extent -562.48,37.52 -537.52,62.48
3D body: height 314.96, standoff -129.92, extent -362.48,-62.48 -337.52,-37.52
3D body: height 314.96, standoff -129.92, extent -262.48,-62.48 -237.52,-37.52
3D body: height 314.96, standoff -129.92, extent -262.48,37.52 -237.52,62.48
3D body: height 314.96, standoff -129.92, extent -362.48,37.52 -337.52,62.48
3D body: height 314.96, standoff -129.92, extent -162.48,-62.48 -137.52,-37.52
3D body: height 314.96, standoff -129.92, extent -62.48,-62.48 -37.52,-37.52
3D body: height 314.96, standoff -129.92, extent -62.48,37.52 -37.52,62.48
3D body: height 314.96, standoff -129.92, extent -162.48,37.52 -137.52,62.48
3D body: height 314.96, standoff -129.92, extent 37.52,-62.48 62.48,-37.52
3D body: height 314.96, standoff -129.92, extent 137.52,-62.48 162.48,-37.52
3D body: height 314.96, standoff -129.92, extent 137.52,37.52 162.48,62.48
3D body: height 314.96, standoff -129.92, extent 37.52,37.52 62.48,62.48
3D body: height 314.96, standoff -129.92, extent 237.52,-62.48 262.48,-37.52
3D body: height 314.96, standoff -129.92, extent 337.52,-62.48 362.48,-37.52
3D body: height 314.96, standoff -129.92, extent 337.52,37.52 362.48,62.48
3D body: height 314.96, standoff -129.92, extent 237.52,37.52 262.48,62.48
3D body: height 314.96, standoff -129.92, extent 437.52,-62.48 462.48,-37.52
3D body: height 314.96, standoff -129.92, extent 537.52,-62.48 562.48,-37.52
3D body: height 314.96, standoff -129.92, extent 537.52,37.52 562.48,62.48
3D body: height 314.96, standoff -129.92, extent 437.52,37.52 462.48,62.48

## FKV_34SN [mil] "Connector; BoxHeader; 17x2 Position ,2.54mm Pitch"
height 346.46
pads (34):
  oval 70x85 hole 48: 1(-800,-50) 2(-800,50) 3(-700,-50) 4(-700,50) 5(-600,-50) 6(-600,50) 7(-500,-50) 8(-500,50) 9(-400,-50) 10(-400,50) 11(-300,-50) 12(-300,50) 13(-200,-50) 14(-200,50) 15(-100,-50) 16(-100,50) 17(0,-50) 18(0,50) 19(100,-50) 20(100,50) 21(200,-50) 22(200,50) 23(300,-50) 24(300,50) 25(400,-50) 26(400,50) 27(500,-50) 28(500,50) 29(600,-50) 30(600,50) 31(700,-50) 32(700,50) 33(800,-50) 34(800,50)
Top Overlay:
  lines w8: -1000,-50 -975,-50 ; -1000,50 -975,50 ; -991.67,-50 -991.67,50 ; -825,-150 -800,-100 -775,-150 ; -75,-175 -75,-150 ; 75,-175 75,-150 ; 975,-50 1000,-50 ; 975,50 1000,50 ; 991.67,-50 991.67,50 ; -75,-150 75,-150 ; -75,-150 -975,-150 -975,150 975,150 975,-150 75,-150 ; -1000,-175 1000,-175 1000,175 -1000,175 -1000,-175
  text "1" at -934,-74 h60
  text "2" at -945,37 h60
Mechanical 13:
  drawing of 284 lines, arcs and shapes, not listed
Mechanical 15:
  lines w3.94: -35,0 0,0 ; 0,-35 0,0 ; 0,35 0,0 ; 35,0 0,0 ; -1010,-185 1010,-185 1010,185 -1010,185 -1010,-185
3D body: height 314.96, standoff -129.92, extent 787.52,37.52 812.48,62.48
3D body: height 314.96, standoff -129.92, extent 787.52,-62.48 812.48,-37.52
3D body: height 314.96, standoff -129.92, extent 587.52,37.52 612.48,62.48
3D body: height 314.96, standoff -129.92, extent 687.52,37.52 712.48,62.48
3D body: height 314.96, standoff -129.92, extent 687.52,-62.48 712.48,-37.52
3D body: height 314.96, standoff -129.92, extent 587.52,-62.48 612.48,-37.52
3D body: height 314.96, standoff -129.92, extent 387.52,37.52 412.48,62.48
3D body: height 314.96, standoff -129.92, extent 487.52,37.52 512.48,62.48
3D body: height 314.96, standoff -129.92, extent 487.52,-62.48 512.48,-37.52
3D body: height 314.96, standoff -129.92, extent 387.52,-62.48 412.48,-37.52
3D body: height 314.96, standoff -129.92, extent 187.52,37.52 212.48,62.48
3D body: height 314.96, standoff -129.92, extent 287.52,37.52 312.48,62.48
3D body: height 314.96, standoff -129.92, extent 287.52,-62.48 312.48,-37.52
3D body: height 314.96, standoff -129.92, extent 187.52,-62.48 212.48,-37.52
3D body: height 314.96, standoff -129.92, extent -12.48,37.52 12.48,62.48
3D body: height 314.96, standoff -129.92, extent 87.52,37.52 112.48,62.48
3D body: height 314.96, standoff -129.92, extent 87.52,-62.48 112.48,-37.52
3D body: height 314.96, standoff -129.92, extent -12.48,-62.48 12.48,-37.52
3D body: height 314.96, standoff -129.92, extent -212.48,37.52 -187.52,62.48
3D body: height 314.96, standoff -129.92, extent -112.48,37.52 -87.52,62.48
3D body: height 314.96, standoff -129.92, extent -112.48,-62.48 -87.52,-37.52
3D body: height 314.96, standoff -129.92, extent -212.48,-62.48 -187.52,-37.52
3D body: height 314.96, standoff -129.92, extent -412.48,37.52 -387.52,62.48
3D body: height 314.96, standoff -129.92, extent -312.48,37.52 -287.52,62.48
3D body: height 314.96, standoff -129.92, extent -312.48,-62.48 -287.52,-37.52
3D body: height 314.96, standoff -129.92, extent -412.48,-62.48 -387.52,-37.52
3D body: height 314.96, standoff -129.92, extent -612.48,37.52 -587.52,62.48
3D body: height 314.96, standoff -129.92, extent -512.48,37.52 -487.52,62.48
3D body: height 314.96, standoff -129.92, extent -512.48,-62.48 -487.52,-37.52
3D body: height 314.96, standoff -129.92, extent -612.48,-62.48 -587.52,-37.52
3D body: height 314.96, standoff -129.92, extent -812.48,37.52 -787.52,62.48
3D body: height 314.96, standoff -129.92, extent -712.48,37.52 -687.52,62.48
3D body: height 314.96, standoff -129.92, extent -712.48,-62.48 -687.52,-37.52
3D body: height 314.96, standoff -129.92, extent -812.48,-62.48 -787.52,-37.52
3D body: height 118.11, standoff 0, extent -74.98,-174.98 74.98,-150.02
3D body: height 78.74, standoff 0, extent -974.98,-149.98 974.98,149.98
3D body: height 346.46, standoff 0, extent -999.98,-174.98 999.98,174.98

## FKV_40SN [mil] "Connector; BoxHeader; 20x2 Position ,2.54mm Pitch"
height 346.46
pads (40):
  oval 70x85 hole 48: 1(-950,-50) 2(-950,50) 3(-850,-50) 4(-850,50) 5(-750,-50) 6(-750,50) 7(-650,-50) 8(-650,50) 9(-550,-50) 10(-550,50) 11(-450,-50) 12(-450,50) 13(-350,-50) 14(-350,50) 15(-250,-50) 16(-250,50) 17(-150,-50) 18(-150,50) 19(-50,-50) 20(-50,50) 21(50,-50) 22(50,50) 23(150,-50) 24(150,50) 25(250,-50) 26(250,50) 27(350,-50) 28(350,50) 29(450,-50) 30(450,50) 31(550,-50) 32(550,50) 33(650,-50) 34(650,50) 35(750,-50) 36(750,50) 37(850,-50) 38(850,50) 39(950,-50) 40(950,50)
Top Overlay:
  lines w8: -1150,-50 -1125,-50 ; -1150,50 -1125,50 ; -1141.67,-50 -1141.67,50 ; -975,-150 -950,-100 -925,-150 ; -75,-175 -75,-150 ; 75,-175 75,-150 ; 1125,-50 1150,-50 ; 1125,50 1150,50 ; 1141.67,-50 1141.67,50 ; -75,-150 75,-150 ; -75,-150 -1125,-150 -1125,150 1125,150 1125,-150 75,-150 ; -1150,-175 1150,-175 1150,175 -1150,175 -1150,-175
  text "2" at -1087,29 h60
  text "1" at -1078,-75 h60
Mechanical 13:
  drawing of 332 lines, arcs and shapes, not listed
Mechanical 15:
  lines w3.94: -35,0 0,0 ; 0,-35 0,0 ; 0,35 0,0 ; 35,0 0,0 ; -1160,-185 -1160,185 1160,185 1160,-185 -1160,-185
3D body: height 314.96, standoff -129.92, extent 537.52,-62.48 562.48,-37.52
3D body: height 314.96, standoff -129.92, extent 637.52,-62.48 662.48,-37.52
3D body: height 314.96, standoff -129.92, extent 637.52,37.52 662.48,62.48
3D body: height 314.96, standoff -129.92, extent 537.52,37.52 562.48,62.48
3D body: height 314.96, standoff -129.92, extent 737.52,-62.48 762.48,-37.52
3D body: height 314.96, standoff -129.92, extent 837.52,-62.48 862.48,-37.52
3D body: height 314.96, standoff -129.92, extent 837.52,37.52 862.48,62.48
3D body: height 314.96, standoff -129.92, extent 737.52,37.52 762.48,62.48
3D body: height 314.96, standoff -129.92, extent 937.52,-62.48 962.48,-37.52
3D body: height 314.96, standoff -129.92, extent 937.52,37.52 962.48,62.48
3D body: height 314.96, standoff -129.92, extent 37.52,-62.48 62.48,-37.52
3D body: height 314.96, standoff -129.92, extent 137.52,-62.48 162.48,-37.52
3D body: height 314.96, standoff -129.92, extent 137.52,37.52 162.48,62.48
3D body: height 314.96, standoff -129.92, extent 37.52,37.52 62.48,62.48
3D body: height 314.96, standoff -129.92, extent 237.52,-62.48 262.48,-37.52
3D body: height 314.96, standoff -129.92, extent 337.52,-62.48 362.48,-37.52
3D body: height 314.96, standoff -129.92, extent 337.52,37.52 362.48,62.48
3D body: height 314.96, standoff -129.92, extent 237.52,37.52 262.48,62.48
3D body: height 314.96, standoff -129.92, extent 437.52,-62.48 462.48,-37.52
3D body: height 314.96, standoff -129.92, extent 437.52,37.52 462.48,62.48
3D body: height 314.96, standoff -129.92, extent -462.48,-62.48 -437.52,-37.52
3D body: height 314.96, standoff -129.92, extent -362.48,-62.48 -337.52,-37.52
3D body: height 314.96, standoff -129.92, extent -362.48,37.52 -337.52,62.48
3D body: height 314.96, standoff -129.92, extent -462.48,37.52 -437.52,62.48
3D body: height 314.96, standoff -129.92, extent -262.48,-62.48 -237.52,-37.52
3D body: height 314.96, standoff -129.92, extent -162.48,-62.48 -137.52,-37.52
3D body: height 314.96, standoff -129.92, extent -162.48,37.52 -137.52,62.48
3D body: height 314.96, standoff -129.92, extent -262.48,37.52 -237.52,62.48
3D body: height 314.96, standoff -129.92, extent -62.48,-62.48 -37.52,-37.52
3D body: height 314.96, standoff -129.92, extent -62.48,37.52 -37.52,62.48
3D body: height 314.96, standoff -129.92, extent -962.48,-62.48 -937.52,-37.52
3D body: height 314.96, standoff -129.92, extent -862.48,-62.48 -837.52,-37.52
3D body: height 314.96, standoff -129.92, extent -862.48,37.52 -837.52,62.48
3D body: height 314.96, standoff -129.92, extent -962.48,37.52 -937.52,62.48
3D body: height 314.96, standoff -129.92, extent -762.48,-62.48 -737.52,-37.52
3D body: height 314.96, standoff -129.92, extent -662.48,-62.48 -637.52,-37.52
3D body: height 314.96, standoff -129.92, extent -662.48,37.52 -637.52,62.48
3D body: height 314.96, standoff -129.92, extent -762.48,37.52 -737.52,62.48
3D body: height 314.96, standoff -129.92, extent -562.48,-62.48 -537.52,-37.52
3D body: height 314.96, standoff -129.92, extent -562.48,37.52 -537.52,62.48
3D body: height 346.46, standoff 0, extent -1149.98,-174.98 1149.98,174.98
3D body: height 78.74, standoff 0, extent -1124.98,-149.98 1124.98,149.98
3D body: height 118.11, standoff 0, extent -74.98,-174.98 74.98,-150.02

## FKV_50SN [mil] "Connector; BoxHeader; 25x2 Position ,2.54mm Pitch"
height 346.46
pads (50):
  oval 70x85 hole 48: 1(-1200,-50) 2(-1200,50) 3(-1100,-50) 4(-1100,50) 5(-1000,-50) 6(-1000,50) 7(-900,-50) 8(-900,50) 9(-800,-50) 10(-800,50) 11(-700,-50) 12(-700,50) 13(-600,-50) 14(-600,50) 15(-500,-50) 16(-500,50) 17(-400,-50) 18(-400,50) 19(-300,-50) 20(-300,50) 21(-200,-50) 22(-200,50) 23(-100,-50) 24(-100,50) 25(0,-50) 26(0,50) 27(100,-50) 28(100,50) 29(200,-50) 30(200,50) 31(300,-50) 32(300,50) 33(400,-50) 34(400,50) 35(500,-50) 36(500,50) 37(600,-50) 38(600,50) 39(700,-50) 40(700,50) 41(800,-50) 42(800,50) 43(900,-50) 44(900,50) 45(1000,-50) 46(1000,50) 47(1100,-50) 48(1100,50) 49(1200,-50) 50(1200,50)
Top Overlay:
  lines w8: -1400,-50 -1375,-50 ; -1400,50 -1375,50 ; -1391.67,-50 -1391.67,50 ; -1225,-150 -1200,-100 -1175,-150 ; -75,-175 -75,-150 ; 75,-175 75,-150 ; 1375,-50 1400,-50 ; 1375,50 1400,50 ; 1391.67,-50 1391.67,50 ; -75,-150 -1375,-150 -1375,150 1375,150 1375,-150 75,-150 ; -75,-150 75,-150 ; -1400,-175 -1400,175 1400,175 1400,-175 -1400,-175
  text "1" at -1335,-71 h60
  text "2" at -1343,34 h60
Mechanical 13:
  drawing of 412 lines, arcs and shapes, not listed
Mechanical 15:
  lines w3.94: -35,0 0,0 ; 0,-35 0,0 ; 0,35 0,0 ; 35,0 0,0 ; -1410,-185 1410,-185 1410,185 -1410,185 -1410,-185
3D body: height 314.96, standoff -129.92, extent 1187.52,37.52 1212.48,62.48
3D body: height 314.96, standoff -129.92, extent 1187.52,-62.48 1212.48,-37.52
3D body: height 314.96, standoff -129.92, extent 987.52,37.52 1012.48,62.48
3D body: height 314.96, standoff -129.92, extent 1087.52,37.52 1112.48,62.48
3D body: height 314.96, standoff -129.92, extent 1087.52,-62.48 1112.48,-37.52
3D body: height 314.96, standoff -129.92, extent 987.52,-62.48 1012.48,-37.52
3D body: height 314.96, standoff -129.92, extent 787.52,37.52 812.48,62.48
3D body: height 314.96, standoff -129.92, extent 887.52,37.52 912.48,62.48
3D body: height 314.96, standoff -129.92, extent 887.52,-62.48 912.48,-37.52
3D body: height 314.96, standoff -129.92, extent 787.52,-62.48 812.48,-37.52
3D body: height 314.96, standoff -129.92, extent 687.52,37.52 712.48,62.48
3D body: height 314.96, standoff -129.92, extent 687.52,-62.48 712.48,-37.52
3D body: height 314.96, standoff -129.92, extent 487.52,37.52 512.48,62.48
3D body: height 314.96, standoff -129.92, extent 587.52,37.52 612.48,62.48
3D body: height 314.96, standoff -129.92, extent 587.52,-62.48 612.48,-37.52
3D body: height 314.96, standoff -129.92, extent 487.52,-62.48 512.48,-37.52
3D body: height 314.96, standoff -129.92, extent 287.52,37.52 312.48,62.48
3D body: height 314.96, standoff -129.92, extent 387.52,37.52 412.48,62.48
3D body: height 314.96, standoff -129.92, extent 387.52,-62.48 412.48,-37.52
3D body: height 314.96, standoff -129.92, extent 287.52,-62.48 312.48,-37.52
3D body: height 314.96, standoff -129.92, extent 187.52,37.52 212.48,62.48
3D body: height 314.96, standoff -129.92, extent 187.52,-62.48 212.48,-37.52
3D body: height 314.96, standoff -129.92, extent -12.48,37.52 12.48,62.48
3D body: height 314.96, standoff -129.92, extent 87.52,37.52 112.48,62.48
3D body: height 314.96, standoff -129.92, extent 87.52,-62.48 112.48,-37.52
3D body: height 314.96, standoff -129.92, extent -12.48,-62.48 12.48,-37.52
3D body: height 314.96, standoff -129.92, extent -212.48,37.52 -187.52,62.48
3D body: height 314.96, standoff -129.92, extent -112.48,37.52 -87.52,62.48
3D body: height 314.96, standoff -129.92, extent -112.48,-62.48 -87.52,-37.52
3D body: height 314.96, standoff -129.92, extent -212.48,-62.48 -187.52,-37.52
3D body: height 314.96, standoff -129.92, extent -312.48,37.52 -287.52,62.48
3D body: height 314.96, standoff -129.92, extent -312.48,-62.48 -287.52,-37.52
3D body: height 314.96, standoff -129.92, extent -512.48,37.52 -487.52,62.48
3D body: height 314.96, standoff -129.92, extent -412.48,37.52 -387.52,62.48
3D body: height 314.96, standoff -129.92, extent -412.48,-62.48 -387.52,-37.52
3D body: height 314.96, standoff -129.92, extent -512.48,-62.48 -487.52,-37.52
3D body: height 314.96, standoff -129.92, extent -712.48,37.52 -687.52,62.48
3D body: height 314.96, standoff -129.92, extent -612.48,37.52 -587.52,62.48
3D body: height 314.96, standoff -129.92, extent -612.48,-62.48 -587.52,-37.52
3D body: height 314.96, standoff -129.92, extent -712.48,-62.48 -687.52,-37.52
3D body: height 314.96, standoff -129.92, extent -812.48,37.52 -787.52,62.48
3D body: height 314.96, standoff -129.92, extent -812.48,-62.48 -787.52,-37.52
3D body: height 314.96, standoff -129.92, extent -1012.48,37.52 -987.52,62.48
3D body: height 314.96, standoff -129.92, extent -912.48,37.52 -887.52,62.48
3D body: height 314.96, standoff -129.92, extent -912.48,-62.48 -887.52,-37.52
3D body: height 314.96, standoff -129.92, extent -1012.48,-62.48 -987.52,-37.52
3D body: height 314.96, standoff -129.92, extent -1212.48,37.52 -1187.52,62.48
3D body: height 314.96, standoff -129.92, extent -1112.48,37.52 -1087.52,62.48
3D body: height 314.96, standoff -129.92, extent -1112.48,-62.48 -1087.52,-37.52
3D body: height 314.96, standoff -129.92, extent -1212.48,-62.48 -1187.52,-37.52
3D body: height 346.46, standoff 0, extent -1399.98,-174.98 1399.98,174.98
3D body: height 78.74, standoff 0, extent -1374.98,-149.98 1374.98,149.98
3D body: height 118.11, standoff 0, extent -74.98,-174.98 74.98,-150.02